# Altium footprint library MyPcbLib.PcbLib: 657 footprints (part 38 of 42)
Each footprint in its own frame and in the unit in brackets; x right, y up, seen from the top. Pads: shape width x height; smd on the part's side, far side on the other; paste and mask are expansions set on the pad; w line width, h text height; cw(c..) or ccw(c..) is an arc to the next point about the centre after c.
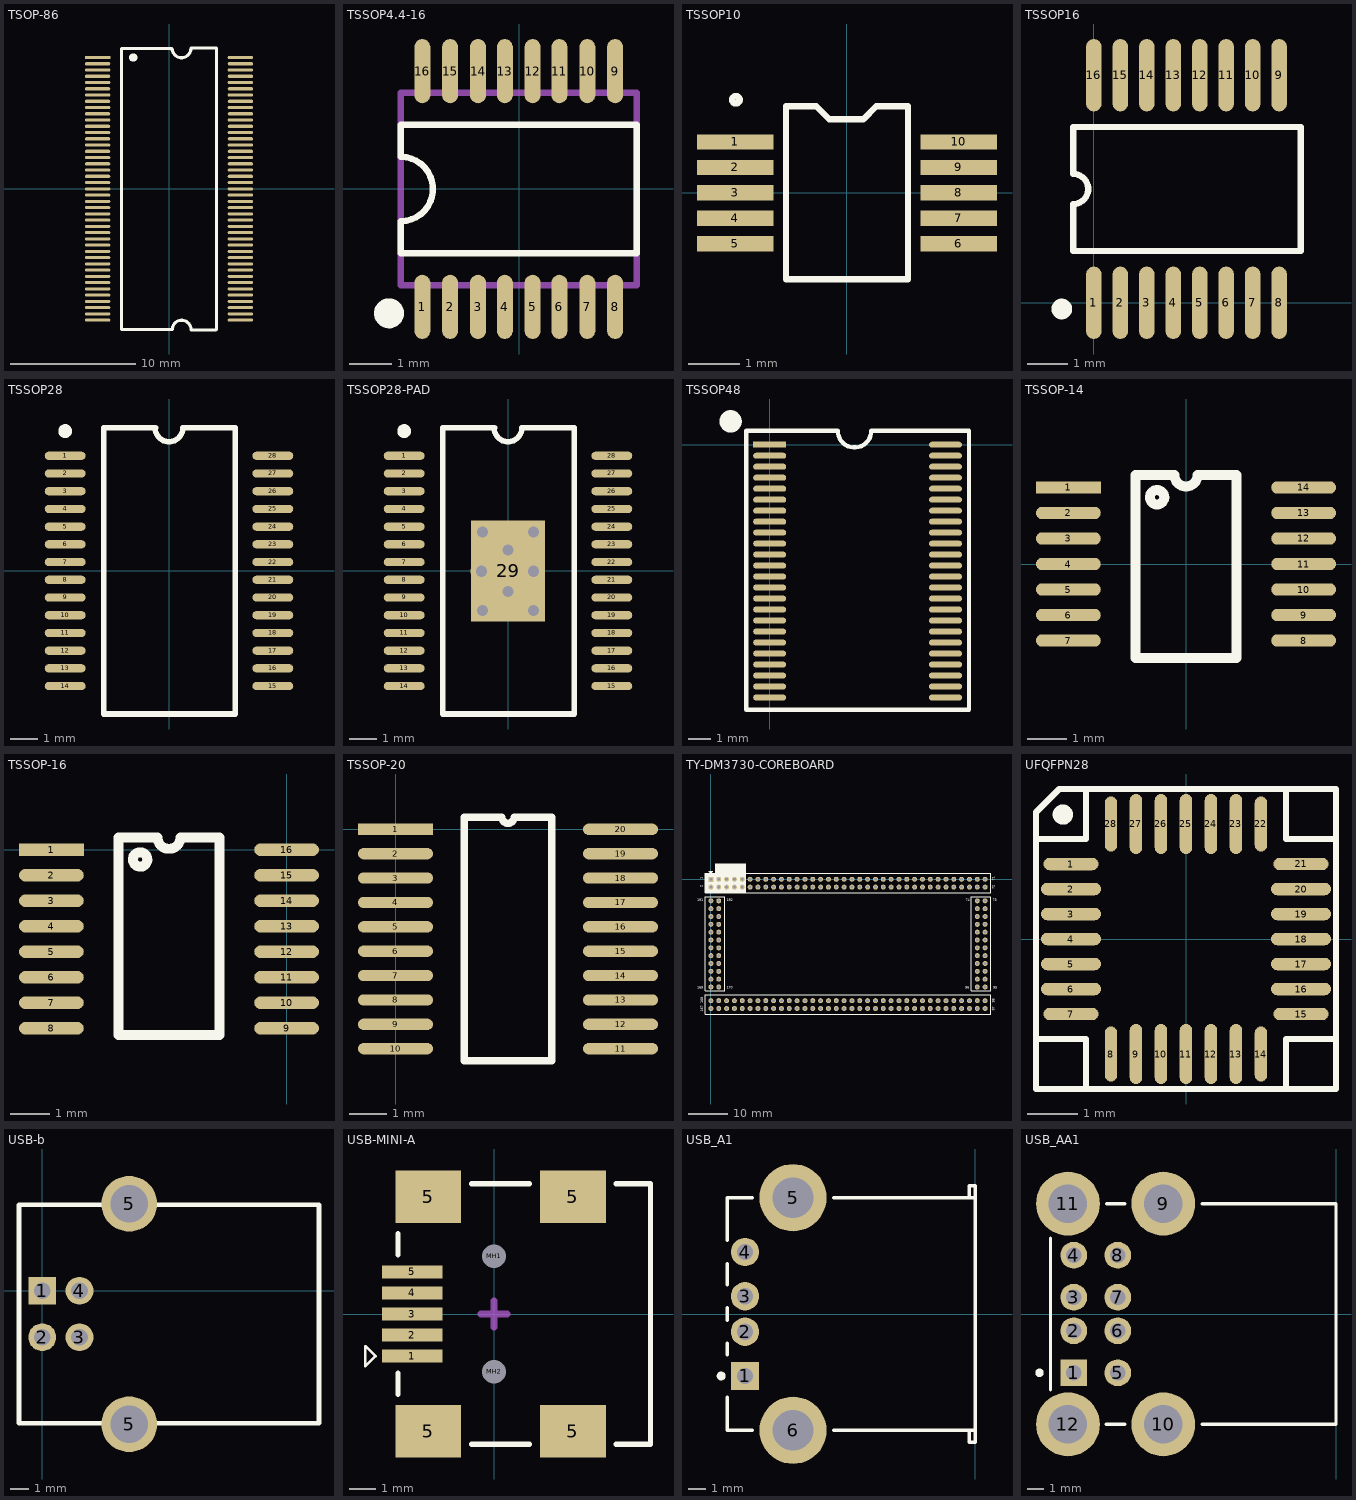
[diagram p37: the footprints below, top view; thin cyan lines are the x and y axes]

## TSOP-86 [mil]
pads (86):
  rect 80x10 smd: 1(-225,413.7)
  oval 80x10 smd: 2(-225,394) 3(-225,374.3) 4(-225,354.6) 5(-225,334.9) 6(-225,315.2) 7(-225,295.5) 8(-225,275.8) 9(-225,256.1) 10(-225,236.4) 11(-225,216.7) 12(-225,197) 13(-225,177.3) 14(-225,157.6) 15(-225,137.9) 16(-225,118.2) 17(-225,98.5) 18(-225,78.8) 19(-225,59.1) 20(-225,39.4) 21(-225,19.7) 22(-225,0) 23(-225,-19.7) 24(-225,-39.4) 25(-225,-59.1) 26(-225,-78.8) 27(-225,-98.5) 28(-225,-118.2) 29(-225,-137.9) 30(-225,-157.6) 31(-225,-177.3) 32(-225,-197) 33(-225,-216.7) 34(-225,-236.4) 35(-225,-256.1) 36(-225,-275.8) 37(-225,-295.5) 38(-225,-315.2) 39(-225,-334.9) 40(-225,-354.6) 41(-225,-374.3) 42(-225,-394) 43(-225,-413.7) 44(225,-413.7) 45(225,-394) 46(225,-374.3) 47(225,-354.6) 48(225,-334.9) 49(225,-315.2) 50(225,-295.5) 51(225,-275.8) 52(225,-256.1) 53(225,-236.4) 54(225,-216.7) 55(225,-197) 56(225,-177.3) 57(225,-157.6) 58(225,-137.9) 59(225,-118.2) 60(225,-98.5) 61(225,-78.8) 62(225,-59.1) 63(225,-39.4) 64(225,-19.7) 65(225,0) 66(225,19.7) 67(225,39.4) 68(225,59.1) 69(225,78.8) 70(225,98.5) 71(225,118.2) 72(225,137.9) 73(225,157.6) 74(225,177.3) 75(225,197) 76(225,216.7) 77(225,236.4) 78(225,256.1) 79(225,275.8) 80(225,295.5) 81(225,315.2) 82(225,334.9) 83(225,354.6) 84(225,374.3) 85(225,394) 86(225,413.7)
Top Overlay:
  circle w23.62: c-113.2,413.7 r1.41
  lines w10: 69,-444.45 148,-444.45 150,-442.45 ; 69,442.55 cw(c39.47,442.55) 9.94,442.55 -150,442.55 -150,-443.55 10.24,-443.55 cw(c39.76,-443.55) 69.29,-443.55 ; 69,443.55 150,443.55 150,-443.55

## TSSOP4.4-16 [mil]
pads (16):
  oval 15x60 smd: 1(-90.55,-110.35) 2(-64.55,-110.35) 3(-38.55,-110.35) 4(-13.55,-110.35) 5(12.45,-110.35) 6(37.45,-110.35) 7(63.45,-110.35) 8(89.45,-110.35) 9(89.45,109.65) 10(63.45,109.65) 11(37.45,109.65) 12(12.45,109.65) 13(-13.55,109.65) 14(-38.55,109.65) 15(-64.55,109.65) 16(-90.55,109.65)
Top Overlay:
  circle w14: c-121.55,-116.35 r7
  lines w6: -110.55,-60.35 -110.55,-30.35 ccw(c-110.55,-0.35) -110.55,29.65 -110.55,59.65 109.45,59.65 109.45,-60.35 -110.55,-60.35
Mechanical 1:
  lines w6: -110.55,-90.35 109.45,-90.35 109.45,89.65 -110.55,89.65 -110.55,-90.35

## TSSOP10 [mm]
pads (10):
  rect 1.5x0.3 smd: 1(-2.2,1) 2(-2.2,0.5) 3(-2.2,0) 4(-2.2,-0.5) 5(-2.2,-1) 6(2.2,-1) 7(2.2,-0.5) 8(2.2,0) 9(2.2,0.5) 10(2.2,1)
Top Overlay:
  circle w0.127: c-2.184,1.829 r0.072
  lines w0.127: -1.2,1.7 -1.2,-1.7 1.2,-1.7 1.2,1.7 ; -1.194,1.702 -0.603,1.702 -0.349,1.448 0.324,1.448 0.578,1.702 1.168,1.702 1.194,1.676

## TSSOP16 [mil]
pads (16):
  oval 15x70 smd: 1(0,0) 2(25.59,0) 3(51.18,0) 4(76.77,0) 5(102.36,0) 6(127.95,0) 7(153.54,0) 8(179.13,0) 9(179.13,220) 10(153.54,220) 11(127.95,220) 12(102.36,220) 13(76.77,220) 14(51.18,220) 15(25.59,220) 16(0,220)
Top Overlay:
  circle w10: c-31,-6 r5
  lines w6: -20,94.35 -20,50 200,50 200,170 -20,170 -20,126.35 ; -20,95.43 ccw(c-20,110) -20,124.57
3D body: height 41.73, standoff -0.2, extent -9.84,-21.6 190.94,234.3

## TSSOP28 [mm]
pads (28):
  oval 1.5x0.305 smd: 1(-3.81,4.225) 2(-3.81,3.575) 3(-3.81,2.925) 4(-3.81,2.275) 5(-3.81,1.625) 6(-3.81,0.975) 7(-3.81,0.325) 8(-3.81,-0.325) 9(-3.81,-0.975) 10(-3.81,-1.625) 11(-3.81,-2.275) 12(-3.81,-2.925) 13(-3.81,-3.575) 14(-3.81,-4.225) 15(3.81,-4.225) 16(3.81,-3.575) 17(3.81,-2.925) 18(3.81,-2.275) 19(3.81,-1.625) 20(3.81,-0.975) 21(3.81,-0.325) 22(3.81,0.325) 23(3.81,0.975) 24(3.81,1.625) 25(3.81,2.275) 26(3.81,2.925) 27(3.81,3.575) 28(3.81,4.225)
Top Overlay:
  circle w0.254: c-3.81,5.131 r0.127
  lines w0.203: -0.508,5.25 ccw(c0,5.25) 0.508,5.25 ; -0.495,5.25 -2.4,5.25 -2.4,-5.25 2.426,-5.25 2.426,5.25 0.5,5.25
3D body: height 1.9, standoff 0, extent -3.824,-5.1 3.976,5.1

## TSSOP28-PAD [mm]
pads (29):
  oval 1.5x0.305 smd: 1(-3.81,4.225) 2(-3.81,3.575) 3(-3.81,2.925) 4(-3.81,2.275) 5(-3.81,1.625) 6(-3.81,0.975) 7(-3.81,0.325) 8(-3.81,-0.325) 9(-3.81,-0.975) 10(-3.81,-1.625) 11(-3.81,-2.275) 12(-3.81,-2.925) 13(-3.81,-3.575) 14(-3.81,-4.225) 15(3.81,-4.225) 16(3.81,-3.575) 17(3.81,-2.925) 18(3.81,-2.275) 19(3.81,-1.625) 20(3.81,-0.975) 21(3.81,-0.325) 22(3.81,0.325) 23(3.81,0.975) 24(3.81,1.625) 25(3.81,2.275) 26(3.81,2.925) 27(3.81,3.575) 28(3.81,4.225)
  rect 2.7x3.7 smd: 29(0,0)
via 0.94,-1.448 diameter 0.813 hole 0.406
via -0.94,-1.448 diameter 0.813 hole 0.406
via 0.94,-0.013 diameter 0.813 hole 0.406
via -0.965,-0.013 diameter 0.813 hole 0.406
via 0.94,1.422 diameter 0.813 hole 0.406
via -0.94,1.422 diameter 0.813 hole 0.406
via 0,0.762 diameter 0.813 hole 0.406
via 0,-0.762 diameter 0.813 hole 0.406
Top Overlay:
  circle w0.254: c-3.81,5.131 r0.127
  lines w0.203: -0.508,5.25 ccw(c0,5.25) 0.508,5.25 ; -0.495,5.25 -2.4,5.25 -2.4,-5.25 2.426,-5.25 2.426,5.25 0.5,5.25
3D body: height 1.9, standoff 0, extent -3.824,-5.1 3.976,5.1

## TSSOP48 [mm]
pads (48):
  rect 1.5x0.27 smd: 1(0,0)
  oval 1.5x0.27 smd: 2(0,-0.5) 3(0,-1) 4(0,-1.5) 5(0,-2) 6(0,-2.5) 7(0,-3) 8(0,-3.5) 9(0,-4) 10(0,-4.5) 11(0,-5) 12(0,-5.5) 13(0,-6) 14(0,-6.5) 15(0,-7) 16(0,-7.5) 17(0,-8) 18(0,-8.5) 19(0,-9) 20(0,-9.5) 21(0,-10) 22(0,-10.5) 23(0,-11) 24(0,-11.5) 25(8,-11.5) 26(8,-11) 27(8,-10.5) 28(8,-10) 29(8,-9.5) 30(8,-9) 31(8,-8.5) 32(8,-8) 33(8,-7.5) 34(8,-7) 35(8,-6.5) 36(8,-6) 37(8,-5.5) 38(8,-5) 39(8,-4.5) 40(8,-4) 41(8,-3.5) 42(8,-3) 43(8,-2.5) 44(8,-2) 45(8,-1.5) 46(8,-1) 47(8,-0.5) 48(8,0)
Top Overlay:
  lines w0.2: -1.067,-12.065 9.068,-12.065 9.068,0.635 4.623,0.635 cw(c3.861,0.635) 3.099,0.635 -1.067,0.635 -1.067,-12.065
  lines w0.508: -1.524,1.092 ccw(c-1.776,1.061) -1.522,1.061

## TSSOP-14 [mil]
height 9.5
pads (14):
  rect 65x12.5 smd: 1(-118,76.77)
  oval 65x12.5 smd: 2(-118,51.18) 3(-118,25.59) 4(-118,0) 5(-118,-25.59) 6(-118,-51.18) 7(-118,-76.77) 8(118,-76.77) 9(118,-51.18) 10(118,-25.59) 11(118,0) 12(118,25.59) 13(118,51.18) 14(118,76.77)
Top Overlay:
  lines w10: -29,59.77 cw(c-29,66.98) -27.98,59.84 ; -50.5,-94.23 -50.5,89.27 -11.54,89.27 ccw(c0,89.27) 11.54,89.27 50.5,89.27 50.5,-94.23 -50.5,-94.23

## TSSOP-16 [mil]
height 9.5
pads (16):
  rect 65x12.5 smd: 1(-236,0)
  oval 65x12.5 smd: 2(-236,-25.59) 3(-236,-51.18) 4(-236,-76.77) 5(-236,-102.36) 6(-236,-127.95) 7(-236,-153.54) 8(-236,-179.13) 9(0,-179.13) 10(0,-153.54) 11(0,-127.95) 12(0,-102.36) 13(0,-76.77) 14(0,-51.18) 15(0,-25.59) 16(0,0)
Top Overlay:
  lines w10: -147,-17 cw(c-147,-9.79) -145.98,-16.93 ; -168.5,-186 -67.5,-186 -67.5,12.5 -106.46,12.5 cw(c-118,12.5) -129.54,12.5 -168.5,12.5 -168.5,-186

## TSSOP-20 [mm]
pads (20):
  rect 2x0.3 smd: 1(0,0)
  oval 2x0.3 smd: 2(0,-0.65) 3(0,-1.3) 4(0,-1.95) 5(0,-2.6) 6(0,-3.25) 7(0,-3.9) 8(0,-4.55) 9(0,-5.2) 10(0,-5.85) 11(6,-5.85) 12(6,-5.2) 13(6,-4.55) 14(6,-3.9) 15(6,-3.25) 16(6,-2.6) 17(6,-1.95) 18(6,-1.3) 19(6,-0.65) 20(6,0)
Top Overlay:
  lines w0.2: 1.835,-6.175 1.835,0.325 2.838,0.325 ccw(c3,0.325) 3.163,0.325 4.165,0.325 4.165,-6.175 1.835,-6.175

## TY-DM3730-COREBOARD [mm]
pads (192):
  rect 1.27x1.27 hole 0.7: 1(0,-0.01)
  round 1.27 hole 0.7: 2(0,-2.01) 3(2,-0.01) 4(2,-2.01) 5(4,-0.01) 6(4,-2.01) 7(6,-0.01) 8(6,-2.01) 9(8,-0.01) 10(8,-2.01) 11(10,-0.01) 12(10,-2.01) 13(12,-0.01) 14(12,-2.01) 15(14,-0.01) 16(14,-2.01) 17(16,-0.01) 18(16,-2.01) 19(18,-0.01) 20(18,-2.01) 21(20,-0.01) 22(20,-2.01) 23(22,-0.01) 24(22,-2.01) 25(24,-0.01) 26(24,-2.01) 27(26,-0.01) 28(26,-2.01) 29(28,-0.01) 30(28,-2.01) 31(30,-0.01) 32(30,-2.01) 33(32,-0.01) 34(32,-2.01) 35(34,-0.01) 36(34,-2.01) 37(36,-0.01) 38(36,-2.01) 39(38,-0.01) 40(38,-2.01) 41(40,-0.01) 42(40,-2.01) 43(42,-0.01) 44(42,-2.01) 45(44,-0.01) 46(44,-2.01) 47(46,-0.01) 48(46,-2.01) 49(48,-0.01) 50(48,-2.01) 51(50,-0.01) 52(50,-2.01) 53(52,-0.01) 54(52,-2.01) 55(54,-0.01) 56(54,-2.01) 57(56,-0.01) 58(56,-2.01) 59(58,-0.01) 60(58,-2.01) 61(60,-0.01) 62(60,-2.01) 63(62,-0.01) 64(62,-2.01) 65(64,-0.01) 66(64,-2.01) 67(66,-0.01) 68(66,-2.01) 69(68,-0.01) 70(68,-2.01) 71(70,-0.01) 72(70,-2.01) 73(70,-5.51) 74(68,-5.51) 75(70,-7.51) 76(68,-7.51) 77(70,-9.51) 78(68,-9.51) 79(70,-11.51) 80(68,-11.51) 81(70,-13.51) 82(68,-13.51) 83(70,-15.51) 84(68,-15.51) 85(70,-17.51) 86(68,-17.51) 87(70,-19.51) 88(68,-19.51) 89(70,-21.51) 90(68,-21.51) 91(70,-23.51) 92(68,-23.51) 93(70,-25.51) 94(68,-25.51) 95(70,-27.51) 96(68,-27.51) 97(70,-33.01) 98(70,-31.01) 99(68,-33.01) 100(68,-31.01) 101(66,-33.01) 102(66,-31.01) 103(64,-33.01) 104(64,-31.01) 105(62,-33.01) 106(62,-31.01) 107(60,-33.01) 108(60,-31.01) 109(58,-33.01) 110(58,-31.01) 111(56,-33.01) 112(56,-31.01) 113(54,-33.01) 114(54,-31.01) 115(52,-33.01) 116(52,-31.01) 117(50,-33.01) 118(50,-31.01) 119(48,-33.01) 120(48,-31.01) 121(46,-33.01) 122(46,-31.01) 123(44,-33.01) 124(44,-31.01) 125(42,-33.01) 126(42,-31.01) 127(40,-33.01) 128(40,-31.01) 129(38,-33.01) 130(38,-31.01) 131(36,-33.01) 132(36,-31.01) 133(34,-33.01) 134(34,-31.01) 135(32,-33.01) 136(32,-31.01) 137(30,-33.01) 138(30,-31.01) 139(28,-33.01) 140(28,-31.01) 141(26,-33.01) 142(26,-31.01) 143(24,-33.01) 144(24,-31.01) 145(22,-33.01) 146(22,-31.01) 147(20,-33.01) 148(20,-31.01) 149(18,-33.01) 150(18,-31.01) 151(16,-33.01) 152(16,-31.01) 153(14,-33.01) 154(14,-31.01) 155(12,-33.01) 156(12,-31.01) 157(10,-33.01) 158(10,-31.01) 159(8,-33.01) 160(8,-31.01) 161(6,-33.01) 162(6,-31.01) 163(4,-33.01) 164(4,-31.01) 165(2,-33.01) 166(2,-31.01) 167(0,-33.01) 168(0,-31.01) 169(0,-27.51) 170(2,-27.51) 171(0,-25.51) 172(2,-25.51) 173(0,-23.51) 174(2,-23.51) 175(0,-21.51) 176(2,-21.51) 177(0,-19.51) 178(2,-19.51) 179(0,-17.51) 180(2,-17.51) 181(0,-15.51) 182(2,-15.51) 183(0,-13.51) 184(2,-13.51) 185(0,-11.51) 186(2,-11.51) 187(0,-9.51) 188(2,-9.51) 189(0,-7.51) 190(2,-7.51) 191(0,-5.51) 192(2,-5.51)
Top Overlay:
  rectangle: -1.469,-3.51 9,1.49
  rectangle: 1,1.49 9,3.99
  lines w0.2: -1.469,-3.51 71.439,-3.51 71.439,1.49 -1.469,1.49 -1.469,-3.51
  lines w0.254: -0.254,2.022 0,1.768 0.254,2.022 ; 0,2.022 0,1.514 ; 0,1.514 -0.508,2.022 0.508,2.022 0,1.514 ; -1.5,-34.51 -1.5,-29.51 71.5,-29.51 71.5,-34.51 -1.5,-34.51 ; -1.5,-28.51 3.5,-28.51 3.5,-4.51 -1.5,-4.51 -1.5,-28.51 ; 66.5,-28.51 66.5,-4.51 71.5,-4.51 71.5,-28.51 66.5,-28.51
  text "168" at -2,-31.61 h0.64
  text "192" at 4.064,-5.598 h0.64
  text "191" at -3.556,-5.598 h0.64
  text "169" at -3.556,-27.95 h0.64
  text "170" at 4.064,-27.95 h0.64
  text "167" at -2,-33.81 h0.64
  text "98" at 72.4,-31.51 h0.64
  text "97" at 72.4,-33.61 h0.64
  text "96" at 64.9,-27.91 h0.64
  text "95" at 72.136,-27.95 h0.64
  text "73" at 72,-5.61 h0.64
  text "74" at 65.024,-5.598 h0.64
  text "72" at 72.4,-2.51 h0.64
  text "71" at 72.4,-0.41 h0.64
  text "2" at -2.032,-2.042 h0.64
  text "1" at -2.032,-0.01 h0.64

## UFQFPN28 [mm]
pads (28):
  oval 1.1x0.25 smd: 1(-2.3,1.5) 7(-2.3,-1.5) 15(2.3,-1.5) 21(2.3,1.5)
  oval 1.2x0.25 smd: 2(-2.3,1) 3(-2.3,0.5) 4(-2.3,0) 5(-2.3,-0.5) 6(-2.3,-1) 16(2.3,-1) 17(2.3,-0.5) 18(2.3,0) 19(2.3,0.5) 20(2.3,1)
  oval 0.25x1.1 smd: 8(-1.5,-2.3) 14(1.5,-2.3) 22(1.5,2.3) 28(-1.5,2.3)
  oval 0.25x1.2 smd: 9(-1,-2.3) 10(-0.5,-2.3) 11(0,-2.3) 12(0.5,-2.3) 13(1,-2.3) 23(1,2.3) 24(0.5,2.3) 25(0,2.3) 26(-0.5,2.3) 27(-1,2.3)
Top Overlay:
  circle w0.203: c-2.464,2.489 r0.1
  lines w0.127: -3,-2 -2,-2 -2,-3 ; -3,2 -2,2 -2,3 ; 2,-3 2,-2 3,-2 ; 2,3 2,2 3,2 ; -3,-3 3,-3 3,3 -2.537,3 -3,2.537 -3,-3

## USB-b [mil]
height 9.5
pads (6):
  rect 60x60 hole 36: 1(0,0)
  round 60 hole 36: 2(0,-100) 3(80,-100) 4(80,0)
  round 120 hole 80: 5(187,-287) 5(187,187)
Top Overlay:
  lines w10: -50,-285 190,-285 595,-285 595,185 190,185 -50,185 -50,-285

## USB-MINI-A [mm] "MINI型USB，7.9*7.5*4.1mm"
pads (11):
  rect 2.3x0.5 smd: 1(-3.108,-1.6) 2(-3.108,-0.8) 3(-3.108,0) 4(-3.108,0.8) 5(-3.108,1.6)
  rect 2.5x2 smd: 5(-2.5,-4.45) 5(-2.5,4.45) 5(3,-4.45) 5(3,4.45)
  round 0.6 hole 0.9 unplated: MH1(0,2.2) MH2(0,-2.2)
Top Overlay:
  lines w0.1: -4.886,-1.981 -4.505,-1.6 -4.886,-1.219 -4.886,-1.981
  lines w0.2: -3.65,-3.05 -3.65,-2.25 ; -3.65,2.25 -3.65,3.05 ; -0.85,-4.95 1.35,-4.95 ; -0.85,4.95 1.35,4.95 ; 4.65,-4.95 5.95,-4.95 5.95,4.95 4.65,4.95
Mechanical 15:
  lines w0.254: -0.508,0 0.508,0 ; 0,-0.508 0,0.508
3D body: height 3.95, standoff -0.7, extent -3.7,-4.75 6,4.75

## USB_A1 [mm]
height 7.01
pads (6):
  rect 1.6x1.6 hole 0.92: 1(-12.99,-3.5)
  round 1.6 hole 0.92: 2(-12.99,-1) 3(-12.99,1) 4(-12.99,3.5)
  round 3.8 hole 2.3: 5(-10.28,6.57) 6(-10.28,-6.57)
Top Overlay:
  circle w0.25: c-14.34,-3.5 r0.125
  lines w0.2: -14,-4.7 -14,-6.565 -12.58,-6.565 ; -14,-2.3 -14,-1.66 ; -14,-0.34 -14,0.34 ; -14,1.66 -14,2.84 ; -14,4.16 -14,6.565 -12.58,6.565 ; -7.98,-6.565 0,-6.565 ; -7.98,6.565 0,6.565 ; -0.32,-6.565 -0.32,-7.25 0,-7.25 0,-6.565 ; -0.32,6.565 -0.32,7.25 0,7.25 0,6.565 ; 0,-6.565 0,6.565

## USB_AA1 [mm] "USB母座A型"
height 15.51
pads (12):
  rect 1.6x1.6 hole 0.92: 1(-15.61,-3.5)
  round 1.6 hole 0.92: 2(-15.61,-1) 3(-15.61,1) 4(-15.61,3.5) 5(-12.99,-3.5) 6(-12.99,-1) 7(-12.99,1) 8(-12.99,3.5)
  round 3.8 hole 2.3: 9(-10.28,6.57) 10(-10.28,-6.57) 11(-15.96,6.57) 12(-15.96,-6.57)
Top Overlay:
  circle w0.25: c-17.65,-3.5 r0.125
  lines w0.2: -17,-4.51 -17,4.51 ; -13.68,-6.565 -12.58,-6.565 ; -13.66,6.565 -12.58,6.565 ; -7.97,-6.565 0,-6.565 0,6.565 -7.97,6.565